# Altium footprint library 电流测试工装板.PcbLib: 36 footprints (part 1 of 3)
Each footprint in its own frame and in the unit in brackets; x right, y up, seen from the top. Pads: shape width x height; smd on the part's side, far side on the other; paste and mask are expansions set on the pad; w line width, h text height; cw(c..) or ccw(c..) is an arc to the next point about the centre after c.
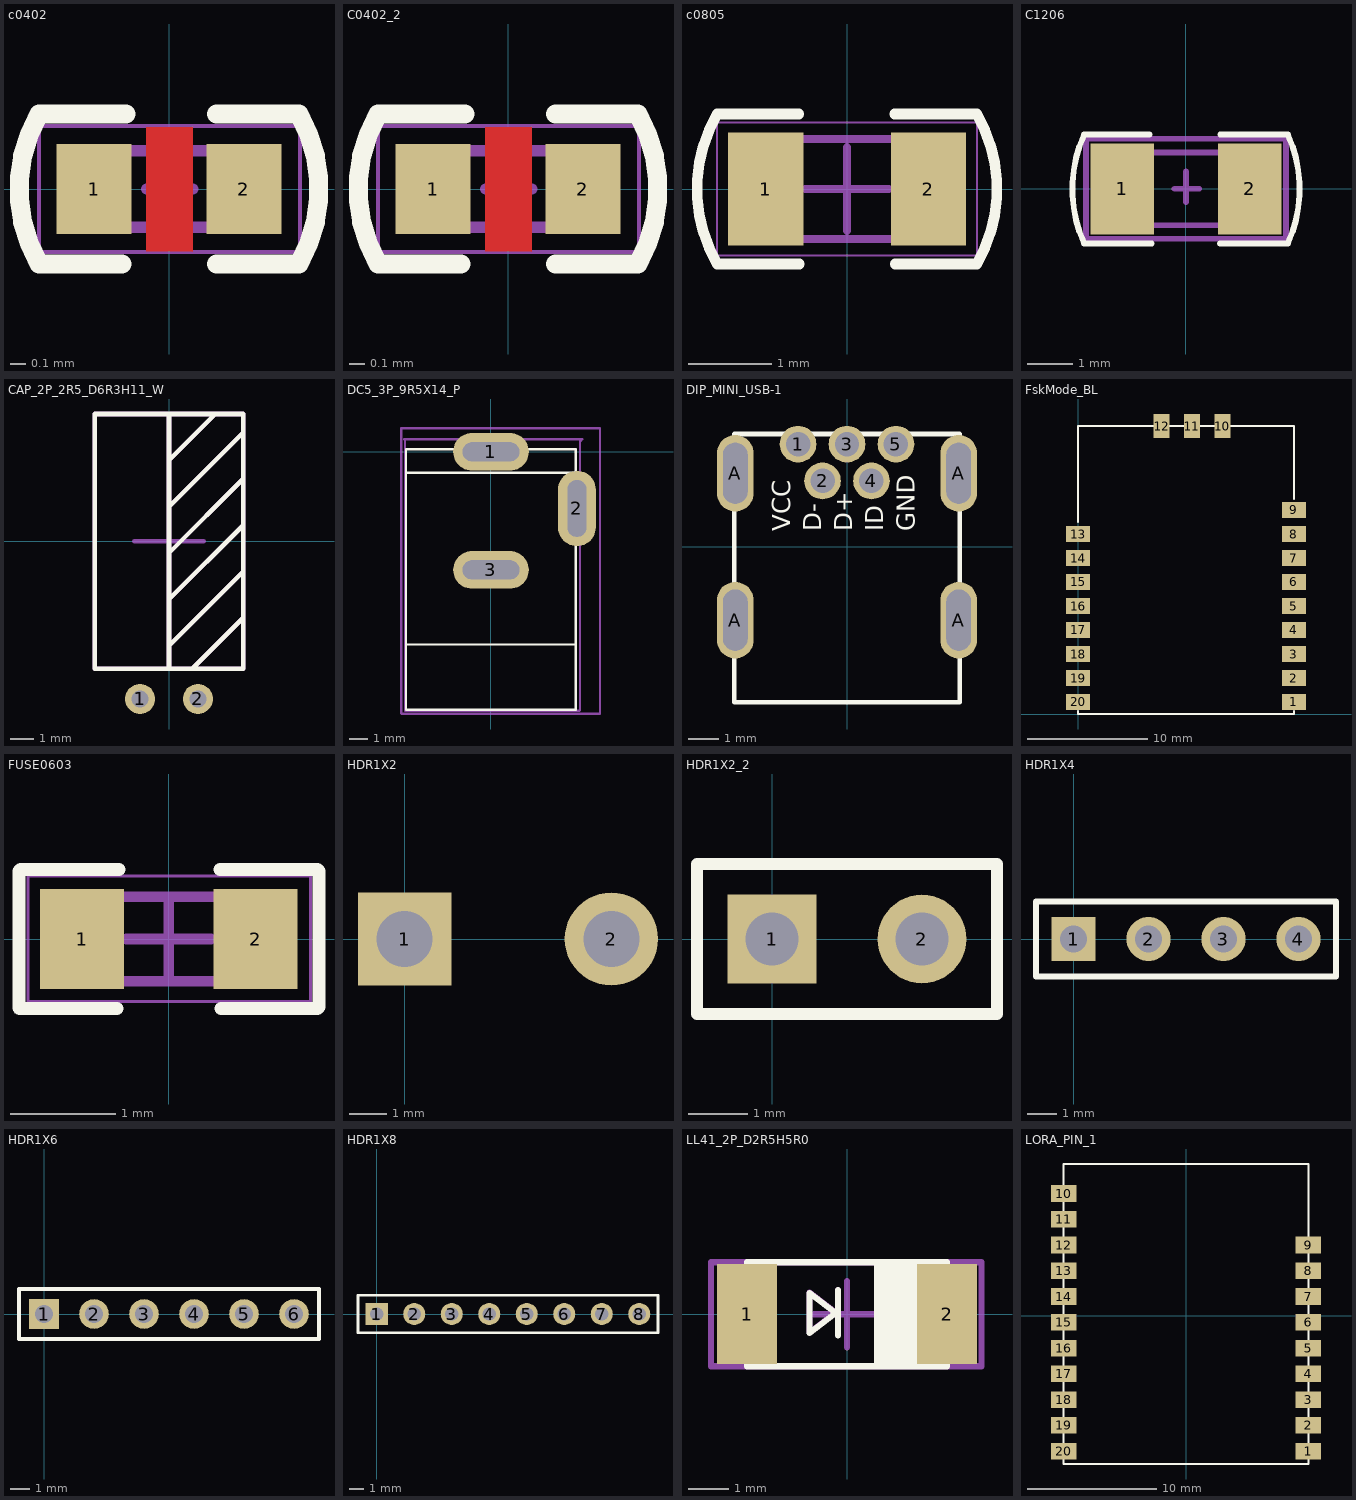
[diagram p0: the footprints below, top view; thin cyan lines are the x and y axes]

## c0402 [mm]
pads (2):
  rect 0.5x0.6 smd: 1(-0.5,0) 2(0.5,0)
Top Layer:
  pour cut-out: -0.15,0.413 -0.15,-0.416 0.16,-0.417 0.16,0.415
Top Overlay:
  lines w0.127: -0.866,-0.5 cw(c0,0) -0.866,0.5 ; -0.862,-0.5 -0.312,-0.5 ; -0.862,0.5 -0.287,0.5 ; 0.317,-0.5 0.866,-0.5 ccw(c0,0) 0.866,0.5 0.317,0.5
Mechanical 13:
  lines w0.076: -0.508,-0.254 -0.508,0.254 0.508,0.254 0.508,-0.254 -0.508,-0.254
Mechanical 15:
  lines w0.025: -0.866,-0.419 -0.866,0.419 0.874,0.419 0.874,-0.419 -0.866,-0.419
  lines w0.076: -0.15,0 0.16,0 ; 0,-0.21 0,0.2
3D body "c0402.step": height 0.51, standoff 0, extent -0.508,-0.254 0.508,0.254
3D body: height 0.01, standoff 0, extent -0.861,-0.429 0.879,0.409

## C0402_2 [mm]
pads (2):
  rect 0.5x0.6 smd: 1(-0.5,0) 2(0.5,0)
Top Layer:
  pour cut-out: -0.15,0.413 -0.15,-0.416 0.16,-0.417 0.16,0.415
Top Overlay:
  lines w0.127: -0.866,-0.5 cw(c0,0) -0.866,0.5 ; -0.862,-0.5 -0.312,-0.5 ; -0.862,0.5 -0.287,0.5 ; 0.317,-0.5 0.866,-0.5 ccw(c0,0) 0.866,0.5 0.317,0.5
Mechanical 13:
  lines w0.076: -0.508,-0.254 -0.508,0.254 0.508,0.254 0.508,-0.254 -0.508,-0.254
Mechanical 15:
  lines w0.025: -0.866,-0.419 -0.866,0.419 0.874,0.419 0.874,-0.419 -0.866,-0.419
  lines w0.076: -0.15,0 0.16,0 ; 0,-0.21 0,0.2
3D body "c0402.step": height 0.51, standoff 0, extent -0.508,-0.254 0.508,0.254
3D body: height 0.01, standoff 0, extent -0.861,-0.429 0.879,0.409

## c0805 [mm]
pads (2):
  rect 0.9x1.35 smd: 1(-0.975,0) 2(0.975,0)
Top Overlay:
  lines w0.127: -0.58,0.9 -1.559,0.9 ccw(c0,0) -1.559,-0.9 -0.571,-0.9 ; 0.571,0.9 1.559,0.9 cw(c0,0) 1.559,-0.9 0.581,-0.9
Mechanical 13:
  lines w0.1: -1,-0.6 1,-0.6 1,0.6 -1,0.6 -1,-0.6
Mechanical 15:
  lines w0.025: -1.56,-0.8 1.56,-0.8 1.56,0.8 -1.56,0.8 -1.56,-0.8
  lines w0.1: -0.5,0 0.5,0 ; 0,-0.5 0,0.5
3D body "c0805.step": height 0.79, standoff 0, extent -1.254,-0.622 1.254,0.622
3D body: height 0.01, standoff 0, extent -1.56,-0.806 1.562,0.807

## C1206 [mm]
pads (2):
  rect 1.4x2 smd: 1(-1.4,0) 2(1.4,0)
Top Overlay:
  lines w0.127: -0.804,1.193 -2.242,1.193 ccw(c0.4,-0.004) -2.242,-1.2 -0.754,-1.2 ; 0.75,-1.2 2.242,-1.2 ccw(c-0.4,-0.004) 2.242,1.193 0.754,1.193
Mechanical 13:
  lines w0.127: -2,-0.8 -2,0.8 -0.4,0.8 2,0.8 2,-0.8 -2,-0.8
Mechanical 15:
  lines w0.127: -0.25,0 -0.001,0 0.29,0 ; 0,-0.29 0,0.38 ; -2.2,-1.1 -2.2,1.1 2.2,1.1 2.2,-0.35 2.2,-1.1 -2.2,-1.1
3D body "c1206.step": height 1.53, standoff 0, extent -2,-0.8 2,0.8
3D body: height 0.01, standoff 0, extent -2.601,-1.1 2.6,1.1

## CAP_2P_2R5_D6R3H11_W [mm]
pads (2):
  round 1.3 hole 0.75: 1(-1.25,-6.8) 2(1.25,-6.8)
Top Overlay:
  lines w0.2: 0,-5.5 0,5.5 ; 0,-4.5 3.2,-1.3 ; 0,-2.5 3.2,0.7 ; 0,-0.5 3.2,2.7 ; 0,1.5 3.2,4.7 ; 1,-5.5 3.2,-3.3 ; 2,5.5 0,3.5 ; 3,5.5 3.2,5.5 ; 0,3.5 0,3.5 ; 3.2,5.5 3.2,-5.5 -3.2,-5.5 -3.2,5.5 3.2,5.5 ; 0,4.5 0,4.5
Mechanical 13:
  lines w0.2: 0,-5.5 0,5.5 ; 0,-4.5 3.2,-1.3 ; 0,-2.5 3.2,0.7 ; 0,-0.5 3.2,2.7 ; 0,1.5 3.2,4.7 ; 1,-5.5 3.2,-3.3 ; 2,5.5 0,3.5 ; 3,5.5 3.2,5.5 ; 0,3.5 0,3.5 ; 3.2,5.5 -3.2,5.5 -3.2,-5.5 3.2,-5.5 3.2,5.5 ; 0,4.5 0,4.5
Mechanical 15:
  lines w0.2: -1.5,0 1.5,0 ; 0,-5.5 0,5.5 ; 0,-4.5 3.2,-1.3 ; 0,-2.5 3.2,0.7 ; 0,-1.5 0,1.5 3.2,4.7 ; 0,-0.5 3.2,2.7 ; 1,-5.5 3.2,-3.3 ; 2,5.5 0,3.5 ; 3,5.5 3.2,5.5 ; 0,3.5 0,3.5 ; 3.2,5.5 -3.2,5.5 -3.2,-5.5 3.2,-5.5 3.2,5.5 ; 0,4.5 0,4.5
3D body "User Library-Cap electro 6_3x11x2_5mm RA.step": height 6.38, standoff -2.8, extent -3.251,-7.66 3.1,5.66

## DC5_3P_9R5X14_P [mm]
pads (3):
  oval 4x2 hole 1 slot 3 at 0 deg: 1(0,0) 3(0,-6.25)
  oval 2x4 hole 1 slot 3 at 90 deg: 2(4.55,-3)
Top Overlay:
  lines w0.127: -4.48,-10.2 4.5,-10.2 ; -4.47,-1.1 4.52,-1.1 ; -4.5,-13.65 4.49,-13.65 4.49,0.13 -4.5,0.13 -4.5,-13.65
Mechanical 13:
  lines w0.127: -4.6,0.66 4.83,0.66 4.71,0.54 4.71,-13.68 4.68,-13.71 -4.55,-13.71 -4.55,0.61 -4.6,0.66
Mechanical 15:
  lines w0.127: 5.77,-13.88 5.77,1.25 -4.75,1.25 -4.75,-13.84 -4.72,-13.87 5.77,-13.87
3D body "DC500.stp": height 11.25, standoff -3.25, extent -4.58,-13.76 4.82,0.64
3D body: height 0.01, standoff 0, extent -4.75,1.17 5.96,1.25
3D body: height 0.01, standoff 0, extent -4.75,-13.88 5.77,1.25
3D body: height 0.01, standoff 0, extent -4.75,-13.87 5.77,1.25

## DIP_MINI_USB-1 [mm]
pads (9):
  round 1.2 hole 0.8: 1(-1.6,3.35) 2(-0.8,2.15) 3(0,3.35) 4(0.8,2.15) 5(1.6,3.35)
  oval 1.2x2.5 hole 0.8 slot 2 at 90 deg: A(-3.65,-2.4) A(-3.65,2.4) A(3.65,-2.4) A(3.65,2.4)
Top Overlay:
  lines w0.15: -3.683,-5.08 3.683,-5.08 3.683,3.683 -3.683,3.683 -3.683,-5.08
  text "VCC" at -1.651,0.508 h1
  text "D-" at -0.646,0.507 h1
  text "D+" at 0.37,0.507 h1
  text "ID" at 1.386,0.507 h1
  text "GND" at 2.413,0.507 h1
3D body "43797.stp": height 3.95, standoff -2.55, extent -4.075,-5.216 4.075,3.609

## FskMode_BL [mm]
pads (20):
  rect 2x1.3 smd: 1(18,1) 2(18,3) 3(18,5) 4(18,7) 5(18,9) 6(18,11) 7(18,13) 8(18,15) 9(18,17) 13(0,15) 14(0,13) 15(0,11) 16(0,9) 17(0,7) 18(0,5) 19(0,3) 20(0,1)
  rect 1.3x2 smd: 10(12.04,24) 11(9.5,24) 12(6.96,24)
Top Overlay:
  lines w0.152: 0,0 18,0 18,0.238 ; 0,0.05 0,0.238 ; 0,15.986 0,24 18,24 ; 18,17.891 18,23.987

## FUSE0603 [mm]
pads (2):
  rect 0.8x0.95 smd: 1(-0.825,0) 2(0.825,0)
Top Overlay:
  lines w0.127: -0.495,-0.66 -1.016,-0.66 -1.42,-0.66 -1.425,-0.655 -1.425,0.645 -1.41,0.66 -1.016,0.66 -0.475,0.66 ; 0.488,0.66 1.016,0.66 1.412,0.66 1.427,0.645 1.427,-0.643 1.41,-0.66 1.016,-0.66 0.495,-0.66
Mechanical 13:
  lines w0.1: -0.8,-0.4 -0.8,0.4 0.8,0.4 0.8,-0.4 -0.8,-0.4
Mechanical 15:
  lines w0.025: -1.339,-0.594 -1.339,0.599 1.346,0.599 1.346,-0.594 -1.339,-0.594
  lines w0.1: -0.4,0 0.4,0 ; 0,-0.4 0,0.4
3D body "fuse0603+.step": height 0.53, standoff 0, extent -0.825,-0.425 0.825,0.425
3D body: height 0.01, standoff 0, extent -1.347,-0.602 1.337,0.612

## HDR1X2 [mm]
pads (2):
  rect 2.5x2.5 hole 1.5: 1(0,0)
  round 2.5 hole 1.5: 2(5.54,0)

## HDR1X2_2 [mm]
pads (2):
  rect 1.5x1.5 hole 0.9: 1(0,0)
  round 1.5 hole 0.9: 2(2.54,0)
Top Overlay:
  lines w0.2: -1.27,-1.27 3.81,-1.27 3.81,1.27 -1.27,1.27 -1.27,-1.27

## HDR1X4 [mm]
pads (4):
  rect 1.5x1.5 hole 0.9: 1(0,0)
  round 1.5 hole 0.9: 2(2.54,0) 3(5.08,0) 4(7.62,0)
Top Overlay:
  lines w0.2: -1.27,-1.27 8.89,-1.27 8.89,1.27 -1.27,1.27 -1.27,-1.27

## HDR1X6 [mm]
pads (6):
  rect 1.5x1.5 hole 0.9: 1(0,0)
  round 1.5 hole 0.9: 2(2.54,0) 3(5.08,0) 4(7.62,0) 5(10.16,0) 6(12.7,0)
Top Overlay:
  lines w0.2: -1.27,-1.27 13.97,-1.27 13.97,1.27 -1.27,1.27 -1.27,-1.27

## HDR1X8 [mm]
pads (8):
  rect 1.5x1.5 hole 0.9: 1(0,0)
  round 1.5 hole 0.9: 2(2.54,0) 3(5.08,0) 4(7.62,0) 5(10.16,0) 6(12.7,0) 7(15.24,0) 8(17.78,0)
Top Overlay:
  lines w0.2: -1.27,-1.27 -1.27,1.27 19.05,1.27 19.05,-1.27 -1.27,-1.27

## LL41_2P_D2R5H5R0 [mm]
pads (2):
  rect 1.5x2.5 smd: 1(-2.5,0) 2(2.5,0)
Top Overlay:
  rectangle: 0.67,-1.3 2.5,1.3
  lines w0.152: -0.23,-0.53 -0.23,0.6 ; -2.5,-1.3 -2.5,1.3 2.5,1.3 2.5,-1.3 -2.5,-1.3 ; -0.94,-0.47 -0.94,0.03 -0.94,0.53 -0.28,0.03 -0.94,-0.47
Mechanical 13:
  rectangle: 0.67,-1.29 2.5,1.31
  lines w0.152: -0.23,-0.52 -0.23,0.61 ; -2.5,-1.3 2.5,-1.3 2.5,1.3 -2.5,1.3 -2.5,-1.3 ; -0.94,-0.46 -0.28,0.04 -0.94,0.54 -0.94,0.04 -0.94,-0.46
Mechanical 15:
  lines w0.152: -0.83,0 0,0 ; 0,-0.83 0,0 ; 0,0.83 0,0 ; 0.83,0 0,0 ; -3.4,-1.3 3.36,-1.3 3.36,1.3 -3.4,1.3 -3.4,-1.3
3D body: height 2.45, standoff -0.05, extent -2.43,-1.23 -2.03,1.27
3D body: height 2.45, standoff -0.05, extent 2.03,-1.21 2.43,1.29
3D body: height 2.51, standoff -0.01, extent 0.88,-1.22 1.38,1.3
3D body: height 2.5, standoff 0, extent -1.24,-1.21 0.76,1.29
3D body: height 2.5, standoff 0, extent -2.449,-1.209 0.049,1.29
3D body: height 2.5, standoff 0, extent -0.049,-1.209 2.449,1.29
3D body: height 2.5, standoff 0, extent -0.76,-1.21 1.24,1.29

## LORA_PIN_1 [mm]
pads (20):
  rect 2x1.3 smd: 1(9.5,-10.5) 2(9.5,-8.5) 3(9.5,-6.5) 4(9.5,-4.5) 5(9.5,-2.5) 6(9.5,-0.5) 7(9.5,1.5) 8(9.5,3.5) 9(9.5,5.5) 10(-9.5,9.5) 11(-9.5,7.5) 12(-9.5,5.5) 13(-9.5,3.5) 14(-9.5,1.5) 15(-9.5,-0.5) 16(-9.5,-2.5) 17(-9.5,-4.5) 18(-9.5,-6.5) 19(-9.5,-8.5) 20(-9.5,-10.5)
Top Overlay:
  lines w0.15: -9.5,-11.5 -9.5,11.8 9.5,11.8 9.5,-11.5 -9.5,-11.5
3D body "LORA_MOD_V1.0.step": height 1.7, standoff -0.01, extent -9.5,-11.5 9.5,11.754